# Altium footprint library con-samtec.PCBLIB: 805 footprints (part 54 of 55) (continued)
## TSW-149-02-S-T [mm] (continued)
  rectangle: -7.97,-0.35 -7.27,0.35
  rectangle: -7.97,2.19 -7.27,2.89
  rectangle: -5.43,-2.89 -4.73,-2.19
  rectangle: -5.43,-0.35 -4.73,0.35
  rectangle: -5.43,2.19 -4.73,2.89
  rectangle: -2.89,-2.89 -2.19,-2.19
  rectangle: -2.89,-0.35 -2.19,0.35
  rectangle: -2.89,2.19 -2.19,2.89
  rectangle: -0.35,-2.89 0.35,-2.19
  rectangle: -0.35,-0.35 0.35,0.35
  rectangle: -0.35,2.19 0.35,2.89
  rectangle: 2.19,-2.89 2.89,-2.19
  rectangle: 2.19,-0.35 2.89,0.35
  rectangle: 2.19,2.19 2.89,2.89
  rectangle: 4.73,-2.89 5.43,-2.19
  rectangle: 4.73,-0.35 5.43,0.35
  rectangle: 4.73,2.19 5.43,2.89
  rectangle: 7.27,-2.89 7.97,-2.19
  rectangle: 7.27,-0.35 7.97,0.35
  rectangle: 7.27,2.19 7.97,2.89
  rectangle: 9.81,-2.89 10.51,-2.19
  rectangle: 9.81,-0.35 10.51,0.35
  rectangle: 9.81,2.19 10.51,2.89
  rectangle: 12.35,-2.89 13.05,-2.19
  rectangle: 12.35,-0.35 13.05,0.35
  rectangle: 12.35,2.19 13.05,2.89
  rectangle: 14.89,-2.89 15.59,-2.19
  rectangle: 14.89,-0.35 15.59,0.35
  rectangle: 14.89,2.19 15.59,2.89
  rectangle: 17.43,-2.89 18.13,-2.19
  rectangle: 17.43,-0.35 18.13,0.35
  rectangle: 17.43,2.19 18.13,2.89
  rectangle: 19.97,-2.89 20.67,-2.19
  rectangle: 19.97,-0.35 20.67,0.35
  rectangle: 19.97,2.19 20.67,2.89
  rectangle: 22.51,-2.89 23.21,-2.19
  rectangle: 22.51,-0.35 23.21,0.35
  rectangle: 22.51,2.19 23.21,2.89
  rectangle: 25.05,-2.89 25.75,-2.19
  rectangle: 25.05,-0.35 25.75,0.35
  rectangle: 25.05,2.19 25.75,2.89
  rectangle: 27.59,-2.89 28.29,-2.19
  rectangle: 27.59,-0.35 28.29,0.35
  rectangle: 27.59,2.19 28.29,2.89
  rectangle: 30.13,-2.89 30.83,-2.19
  rectangle: 30.13,-0.35 30.83,0.35
  rectangle: 30.13,2.19 30.83,2.89
  rectangle: 32.67,-2.89 33.37,-2.19
  rectangle: 32.67,-0.35 33.37,0.35
  rectangle: 32.67,2.19 33.37,2.89
  rectangle: 35.21,-2.89 35.91,-2.19
  rectangle: 35.21,-0.35 35.91,0.35
  rectangle: 35.21,2.19 35.91,2.89
  rectangle: 37.75,-2.89 38.45,-2.19
  rectangle: 37.75,-0.35 38.45,0.35
  rectangle: 37.75,2.19 38.45,2.89
  rectangle: 40.29,-2.89 40.99,-2.19
  rectangle: 40.29,-0.35 40.99,0.35
  rectangle: 40.29,2.19 40.99,2.89
  rectangle: 42.83,-2.89 43.53,-2.19
  rectangle: 42.83,-0.35 43.53,0.35
  rectangle: 42.83,2.19 43.53,2.89
  rectangle: 45.37,-2.89 46.07,-2.19
  rectangle: 45.37,-0.35 46.07,0.35
  rectangle: 45.37,2.19 46.07,2.89
  rectangle: 47.91,-2.89 48.61,-2.19
  rectangle: 47.91,-0.35 48.61,0.35
  rectangle: 47.91,2.19 48.61,2.89
  rectangle: 50.45,-2.89 51.15,-2.19
  rectangle: 50.45,-0.35 51.15,0.35
  rectangle: 50.45,2.19 51.15,2.89
  rectangle: 52.99,-2.89 53.69,-2.19
  rectangle: 52.99,-0.35 53.69,0.35
  rectangle: 52.99,2.19 53.69,2.89
  rectangle: 55.53,-2.89 56.23,-2.19
  rectangle: 55.53,-0.35 56.23,0.35
  rectangle: 55.53,2.19 56.23,2.89
  rectangle: 58.07,-2.89 58.77,-2.19
  rectangle: 58.07,-0.35 58.77,0.35
  rectangle: 58.07,2.19 58.77,2.89
  rectangle: 60.61,-2.89 61.31,-2.19
  rectangle: 60.61,-0.35 61.31,0.35
  rectangle: 60.61,2.19 61.31,2.89

## TSW-149-02-S-T-RA [mil]
pads (147):
  oct 59.06x59.06 hole 39.37: 1(2400,60) 2(2400,160) 3(2400,260) 4(2300,60) 5(2300,160) 6(2300,260) 7(2200,60) 8(2200,160) 9(2200,260) 10(2100,60) 11(2100,160) 12(2100,260) 13(2000,60) 14(2000,160) 15(2000,260) 16(1900,60) 17(1900,160) 18(1900,260) 19(1800,60) 20(1800,160) 21(1800,260) 22(1700,60) 23(1700,160) 24(1700,260) 25(1600,60) 26(1600,160) 27(1600,260) 28(1500,60) 29(1500,160) 30(1500,260) 31(1400,60) 32(1400,160) 33(1400,260) 34(1300,60) 35(1300,160) 36(1300,260) 37(1200,60) 38(1200,160) 39(1200,260) 40(1100,60) 41(1100,160) 42(1100,260) 43(1000,60) 44(1000,160) 45(1000,260) 46(900,60) 47(900,160) 48(900,260) 49(800,60) 50(800,160) 51(800,260) 52(700,60) 53(700,160) 54(700,260) 55(600,60) 56(600,160) 57(600,260) 58(500,60) 59(500,160) 60(500,260) 61(400,60) 62(400,160) 63(400,260) 64(300,60) 65(300,160) 66(300,260) 67(200,60) 68(200,160) 69(200,260) 70(100,60) 71(100,160) 72(100,260) 73(0,60) 74(0,160) 75(0,260) 76(-100,60) 77(-100,160) 78(-100,260) 79(-200,60) 80(-200,160) 81(-200,260) 82(-300,60) 83(-300,160) 84(-300,260) 85(-400,60) 86(-400,160) 87(-400,260) 88(-500,60) 89(-500,160) 90(-500,260) 91(-600,60) 92(-600,160) 93(-600,260) 94(-700,60) 95(-700,160) 96(-700,260) 97(-800,60) 98(-800,160) 99(-800,260) 100(-900,60) 101(-900,160) 102(-900,260) 103(-1000,60) 104(-1000,160) 105(-1000,260) 106(-1100,60) 107(-1100,160) 108(-1100,260) 109(-1200,60) 110(-1200,160) 111(-1200,260) 112(-1300,60) 113(-1300,160) 114(-1300,260) 115(-1400,60) 116(-1400,160) 117(-1400,260) 118(-1500,60) 119(-1500,160) 120(-1500,260) 121(-1600,60) 122(-1600,160) 123(-1600,260) 124(-1700,60) 125(-1700,160) 126(-1700,260) 127(-1800,60) 128(-1800,160) 129(-1800,260) 130(-1900,60) 131(-1900,160) 132(-1900,260) 133(-2000,60) 134(-2000,160) 135(-2000,260) 136(-2100,60) 137(-2100,160) 138(-2100,260) 139(-2200,60) 140(-2200,160) 141(-2200,260) 142(-2300,60) 143(-2300,160) 144(-2300,260) 145(-2400,60) 146(-2400,160) 147(-2400,260)
Top Overlay:
  rectangle: -2410,-310.63 -2390,-80.32
  rectangle: -2310,-310.63 -2290,-80.32
  rectangle: -2210,-310.63 -2190,-80.32
  rectangle: -2110,-310.63 -2090,-80.32
  rectangle: -2010,-310.63 -1990,-80.32
  rectangle: -1910,-310.63 -1890,-80.32
  rectangle: -1810,-310.63 -1790,-80.32
  rectangle: -1710,-310.63 -1690,-80.32
  rectangle: -1610,-310.63 -1590,-80.32
  rectangle: -1510,-310.63 -1490,-80.32
  rectangle: -1410,-310.63 -1390,-80.32
  rectangle: -1310,-310.63 -1290,-80.32
  rectangle: -1210,-310.63 -1190,-80.32
  rectangle: -1110,-310.63 -1090,-80.32
  rectangle: -1010,-310.63 -990,-80.32
  rectangle: -910,-310.63 -890,-80.32
  rectangle: -810,-310.63 -790,-80.32
  rectangle: -710,-310.63 -690,-80.32
  rectangle: -610,-310.63 -590,-80.32
  rectangle: -510,-310.63 -490,-80.32
  rectangle: -410,-310.63 -390,-80.32
  rectangle: -310,-310.63 -290,-80.32
  rectangle: -210,-310.63 -190,-80.32
  rectangle: -110,-310.63 -90,-80.32
  rectangle: -10,-310.63 10,-80.32
  rectangle: 90,-310.63 110,-80.32
  rectangle: 190,-310.63 210,-80.32
  rectangle: 290,-310.63 310,-80.32
  rectangle: 390,-310.63 410,-80.32
  rectangle: 490,-310.63 510,-80.32
  rectangle: 590,-310.63 610,-80.32
  rectangle: 690,-310.63 710,-80.32
  rectangle: 790,-310.63 810,-80.32
  rectangle: 890,-310.63 910,-80.32
  rectangle: 990,-310.63 1010,-80.32
  rectangle: 1090,-310.63 1110,-80.32
  rectangle: 1190,-310.63 1210,-80.32
  rectangle: 1290,-310.63 1310,-80.32
  rectangle: 1390,-310.63 1410,-80.32
  rectangle: 1490,-310.63 1510,-80.32
  rectangle: 1590,-310.63 1610,-80.32
  rectangle: 1690,-310.63 1710,-80.32
  rectangle: 1790,-310.63 1810,-80.32
  rectangle: 1890,-310.63 1910,-80.32
  rectangle: 1990,-310.63 2010,-80.32
  rectangle: 2090,-310.63 2110,-80.32
  rectangle: 2190,-310.63 2210,-80.32
  rectangle: 2290,-310.63 2310,-80.32
  rectangle: 2390,-310.63 2410,-80.32
  lines w8: -2455.08,-80.55 2455.08,-80.55 2455.08,-4.17 -2455.08,-4.17 -2455.08,-80.55
  text "1" at 2451.57,41.34 h36.81
  text "3" at 2452.17,236.81 h36.81
Mechanical 16:
  rectangle: -2410,0 -2390,270
  rectangle: -2310,0 -2290,270
  rectangle: -2210,0 -2190,270
  rectangle: -2110,0 -2090,270
  rectangle: -2010,0 -1990,270
  rectangle: -1910,0 -1890,270
  rectangle: -1810,0 -1790,270
  rectangle: -1710,0 -1690,270
  rectangle: -1610,0 -1590,270
  rectangle: -1510,0 -1490,270
  rectangle: -1410,0 -1390,270
  rectangle: -1310,0 -1290,270
  rectangle: -1210,0 -1190,270
  rectangle: -1110,0 -1090,270
  rectangle: -1010,0 -990,270
  rectangle: -910,0 -890,270
  rectangle: -810,0 -790,270
  rectangle: -710,0 -690,270
  rectangle: -610,0 -590,270
  rectangle: -510,0 -490,270
  rectangle: -410,0 -390,270
  rectangle: -310,0 -290,270
  rectangle: -210,0 -190,270
  rectangle: -110,0 -90,270
  rectangle: -10,0 10,270
  rectangle: 90,0 110,270
  rectangle: 190,0 210,270
  rectangle: 290,0 310,270
  rectangle: 390,0 410,270
  rectangle: 490,0 510,270
  rectangle: 590,0 610,270
  rectangle: 690,0 710,270
  rectangle: 790,0 810,270
  rectangle: 890,0 910,270
  rectangle: 990,0 1010,270
  rectangle: 1090,0 1110,270
  rectangle: 1190,0 1210,270
  rectangle: 1290,0 1310,270
  rectangle: 1390,0 1410,270
  rectangle: 1490,0 1510,270
  rectangle: 1590,0 1610,270
  rectangle: 1690,0 1710,270
  rectangle: 1790,0 1810,270
  rectangle: 1890,0 1910,270
  rectangle: 1990,0 2010,270
  rectangle: 2090,0 2110,270
  rectangle: 2190,0 2210,270
  rectangle: 2290,0 2310,270
  rectangle: 2390,0 2410,270

## TSW-150-02-S-D [mm]
pads (100):
  oct 1.5x1.5 hole 1: 1(62.23,-1.27) 2(62.23,1.27) 3(59.69,-1.27) 4(59.69,1.27) 5(57.15,-1.27) 6(57.15,1.27) 7(54.61,-1.27) 8(54.61,1.27) 9(52.07,-1.27) 10(52.07,1.27) 11(49.53,-1.27) 12(49.53,1.27) 13(46.99,-1.27) 14(46.99,1.27) 15(44.45,-1.27) 16(44.45,1.27) 17(41.91,-1.27) 18(41.91,1.27) 19(39.37,-1.27) 20(39.37,1.27) 21(36.83,-1.27) 22(36.83,1.27) 23(34.29,-1.27) 24(34.29,1.27) 25(31.75,-1.27) 26(31.75,1.27) 27(29.21,-1.27) 28(29.21,1.27) 29(26.67,-1.27) 30(26.67,1.27) 31(24.13,-1.27) 32(24.13,1.27) 33(21.59,-1.27) 34(21.59,1.27) 35(19.05,-1.27) 36(19.05,1.27) 37(16.51,-1.27) 38(16.51,1.27) 39(13.97,-1.27) 40(13.97,1.27) 41(11.43,-1.27) 42(11.43,1.27) 43(8.89,-1.27) 44(8.89,1.27) 45(6.35,-1.27) 46(6.35,1.27) 47(3.81,-1.27) 48(3.81,1.27) 49(1.27,-1.27) 50(1.27,1.27) 51(-1.27,-1.27) 52(-1.27,1.27) 53(-3.81,-1.27) 54(-3.81,1.27) 55(-6.35,-1.27) 56(-6.35,1.27) 57(-8.89,-1.27) 58(-8.89,1.27) 59(-11.43,-1.27) 60(-11.43,1.27) 61(-13.97,-1.27) 62(-13.97,1.27) 63(-16.51,-1.27) 64(-16.51,1.27) 65(-19.05,-1.27) 66(-19.05,1.27) 67(-21.59,-1.27) 68(-21.59,1.27) 69(-24.13,-1.27) 70(-24.13,1.27) 71(-26.67,-1.27) 72(-26.67,1.27) 73(-29.21,-1.27) 74(-29.21,1.27) 75(-31.75,-1.27) 76(-31.75,1.27) 77(-34.29,-1.27) 78(-34.29,1.27) 79(-36.83,-1.27) 80(-36.83,1.27) 81(-39.37,-1.27) 82(-39.37,1.27) 83(-41.91,-1.27) 84(-41.91,1.27) 85(-44.45,-1.27) 86(-44.45,1.27) 87(-46.99,-1.27) 88(-46.99,1.27) 89(-49.53,-1.27) 90(-49.53,1.27) 91(-52.07,-1.27) 92(-52.07,1.27) 93(-54.61,-1.27) 94(-54.61,1.27) 95(-57.15,-1.27) 96(-57.15,1.27) 97(-59.69,-1.27) 98(-59.69,1.27) 99(-62.23,-1.27) 100(-62.23,1.27)
Top Overlay:
  lines w0.203: -63.629,-2.425 63.629,-2.425 63.629,2.425 -63.629,2.425 -63.629,-2.425
  text "1" at 62.022,-3.818 h0.94
  text "2" at 61.847,2.744 h0.94
  text "99" at -63.25,-3.768 h0.94
  text "100" at -63.604,2.694 h0.94
Mechanical 16:
  rectangle: -62.58,-1.62 -61.88,-0.92
  rectangle: -62.58,0.92 -61.88,1.62
  rectangle: -60.04,-1.62 -59.34,-0.92
  rectangle: -60.04,0.92 -59.34,1.62
  rectangle: -57.5,-1.62 -56.8,-0.92
  rectangle: -57.5,0.92 -56.8,1.62
  rectangle: -54.96,-1.62 -54.26,-0.92
  rectangle: -54.96,0.92 -54.26,1.62
  rectangle: -52.42,-1.62 -51.72,-0.92
  rectangle: -52.42,0.92 -51.72,1.62
  rectangle: -49.88,-1.62 -49.18,-0.92
  rectangle: -49.88,0.92 -49.18,1.62
  rectangle: -47.34,-1.62 -46.64,-0.92
  rectangle: -47.34,0.92 -46.64,1.62
  rectangle: -44.8,-1.62 -44.1,-0.92
  rectangle: -44.8,0.92 -44.1,1.62
  rectangle: -42.26,-1.62 -41.56,-0.92
  rectangle: -42.26,0.92 -41.56,1.62
  rectangle: -39.72,-1.62 -39.02,-0.92
  rectangle: -39.72,0.92 -39.02,1.62
  rectangle: -37.18,-1.62 -36.48,-0.92
  rectangle: -37.18,0.92 -36.48,1.62
  rectangle: -34.64,-1.62 -33.94,-0.92
  rectangle: -34.64,0.92 -33.94,1.62
  rectangle: -32.1,-1.62 -31.4,-0.92
  rectangle: -32.1,0.92 -31.4,1.62
  rectangle: -29.56,-1.62 -28.86,-0.92
  rectangle: -29.56,0.92 -28.86,1.62
  rectangle: -27.02,-1.62 -26.32,-0.92
  rectangle: -27.02,0.92 -26.32,1.62
  rectangle: -24.48,-1.62 -23.78,-0.92
  rectangle: -24.48,0.92 -23.78,1.62
  rectangle: -21.94,-1.62 -21.24,-0.92
  rectangle: -21.94,0.92 -21.24,1.62
  rectangle: -19.4,-1.62 -18.7,-0.92
  rectangle: -19.4,0.92 -18.7,1.62
  rectangle: -16.86,-1.62 -16.16,-0.92
  rectangle: -16.86,0.92 -16.16,1.62
  rectangle: -14.32,-1.62 -13.62,-0.92
  rectangle: -14.32,0.92 -13.62,1.62
  rectangle: -11.78,-1.62 -11.08,-0.92
  rectangle: -11.78,0.92 -11.08,1.62
  rectangle: -9.24,-1.62 -8.54,-0.92
  rectangle: -9.24,0.92 -8.54,1.62
  rectangle: -6.7,-1.62 -6,-0.92
  rectangle: -6.7,0.92 -6,1.62
  rectangle: -4.16,-1.62 -3.46,-0.92
  rectangle: -4.16,0.92 -3.46,1.62
  rectangle: -1.62,-1.62 -0.92,-0.92
  rectangle: -1.62,0.92 -0.92,1.62
  rectangle: 0.92,-1.62 1.62,-0.92
  rectangle: 0.92,0.92 1.62,1.62
  rectangle: 3.46,-1.62 4.16,-0.92
  rectangle: 3.46,0.92 4.16,1.62
  rectangle: 6,-1.62 6.7,-0.92
  rectangle: 6,0.92 6.7,1.62
  rectangle: 8.54,-1.62 9.24,-0.92
  rectangle: 8.54,0.92 9.24,1.62
  rectangle: 11.08,-1.62 11.78,-0.92
  rectangle: 11.08,0.92 11.78,1.62
  rectangle: 13.62,-1.62 14.32,-0.92
  rectangle: 13.62,0.92 14.32,1.62
  rectangle: 16.16,-1.62 16.86,-0.92
  rectangle: 16.16,0.92 16.86,1.62
  rectangle: 18.7,-1.62 19.4,-0.92
  rectangle: 18.7,0.92 19.4,1.62
  rectangle: 21.24,-1.62 21.94,-0.92
  rectangle: 21.24,0.92 21.94,1.62
  rectangle: 23.78,-1.62 24.48,-0.92
  rectangle: 23.78,0.92 24.48,1.62
  rectangle: 26.32,-1.62 27.02,-0.92
  rectangle: 26.32,0.92 27.02,1.62
  rectangle: 28.86,-1.62 29.56,-0.92
  rectangle: 28.86,0.92 29.56,1.62
  rectangle: 31.4,-1.62 32.1,-0.92
  rectangle: 31.4,0.92 32.1,1.62
  rectangle: 33.94,-1.62 34.64,-0.92
  rectangle: 33.94,0.92 34.64,1.62
  rectangle: 36.48,-1.62 37.18,-0.92
  rectangle: 36.48,0.92 37.18,1.62
  rectangle: 39.02,-1.62 39.72,-0.92
  rectangle: 39.02,0.92 39.72,1.62
  rectangle: 41.56,-1.62 42.26,-0.92
  rectangle: 41.56,0.92 42.26,1.62
  rectangle: 44.1,-1.62 44.8,-0.92
  rectangle: 44.1,0.92 44.8,1.62
  rectangle: 46.64,-1.62 47.34,-0.92
  rectangle: 46.64,0.92 47.34,1.62
  rectangle: 49.18,-1.62 49.88,-0.92
  rectangle: 49.18,0.92 49.88,1.62
  rectangle: 51.72,-1.62 52.42,-0.92
  rectangle: 51.72,0.92 52.42,1.62
  rectangle: 54.26,-1.62 54.96,-0.92
  rectangle: 54.26,0.92 54.96,1.62
  rectangle: 56.8,-1.62 57.5,-0.92
  rectangle: 56.8,0.92 57.5,1.62
  rectangle: 59.34,-1.62 60.04,-0.92
  rectangle: 59.34,0.92 60.04,1.62
  rectangle: 61.88,-1.62 62.58,-0.92
  rectangle: 61.88,0.92 62.58,1.62

## TSW-150-02-S-D-RA [mil]
pads (100):
  oct 59.06x59.06 hole 39.37: 1(2450,60) 2(2450,160) 3(2350,60) 4(2350,160) 5(2250,60) 6(2250,160) 7(2150,60) 8(2150,160) 9(2050,60) 10(2050,160) 11(1950,60) 12(1950,160) 13(1850,60) 14(1850,160) 15(1750,60) 16(1750,160) 17(1650,60) 18(1650,160) 19(1550,60) 20(1550,160) 21(1450,60) 22(1450,160) 23(1350,60) 24(1350,160) 25(1250,60) 26(1250,160) 27(1150,60) 28(1150,160) 29(1050,60) 30(1050,160) 31(950,60) 32(950,160) 33(850,60) 34(850,160) 35(750,60) 36(750,160) 37(650,60) 38(650,160) 39(550,60) 40(550,160) 41(450,60) 42(450,160) 43(350,60) 44(350,160) 45(250,60) 46(250,160) 47(150,60) 48(150,160) 49(50,60) 50(50,160) 51(-50,60) 52(-50,160) 53(-150,60) 54(-150,160) 55(-250,60) 56(-250,160) 57(-350,60) 58(-350,160) 59(-450,60) 60(-450,160) 61(-550,60) 62(-550,160) 63(-650,60) 64(-650,160) 65(-750,60) 66(-750,160) 67(-850,60) 68(-850,160) 69(-950,60) 70(-950,160) 71(-1050,60) 72(-1050,160) 73(-1150,60) 74(-1150,160) 75(-1250,60) 76(-1250,160) 77(-1350,60) 78(-1350,160) 79(-1450,60) 80(-1450,160) 81(-1550,60) 82(-1550,160) 83(-1650,60) 84(-1650,160) 85(-1750,60) 86(-1750,160) 87(-1850,60) 88(-1850,160) 89(-1950,60) 90(-1950,160) 91(-2050,60) 92(-2050,160) 93(-2150,60) 94(-2150,160) 95(-2250,60) 96(-2250,160) 97(-2350,60) 98(-2350,160) 99(-2450,60) 100(-2450,160)
Top Overlay:
  rectangle: -2460,-310.63 -2440,-80.32
  rectangle: -2360,-310.63 -2340,-80.32
  rectangle: -2260,-310.63 -2240,-80.32
  rectangle: -2160,-310.63 -2140,-80.32
  rectangle: -2060,-310.63 -2040,-80.32
  rectangle: -1960,-310.63 -1940,-80.32
  rectangle: -1860,-310.63 -1840,-80.32
  rectangle: -1760,-310.63 -1740,-80.32
  rectangle: -1660,-310.63 -1640,-80.32
  rectangle: -1560,-310.63 -1540,-80.32
  rectangle: -1460,-310.63 -1440,-80.32
  rectangle: -1360,-310.63 -1340,-80.32
  rectangle: -1260,-310.63 -1240,-80.32
  rectangle: -1160,-310.63 -1140,-80.32
  rectangle: -1060,-310.63 -1040,-80.32
  rectangle: -960,-310.63 -940,-80.32
  rectangle: -860,-310.63 -840,-80.32
  rectangle: -760,-310.63 -740,-80.32
  rectangle: -660,-310.63 -640,-80.32
  rectangle: -560,-310.63 -540,-80.32
  rectangle: -460,-310.63 -440,-80.32
  rectangle: -360,-310.63 -340,-80.32
  rectangle: -260,-310.63 -240,-80.32
  rectangle: -160,-310.63 -140,-80.32
  rectangle: -60,-310.63 -40,-80.32
  rectangle: 40,-310.63 60,-80.32
  rectangle: 140,-310.63 160,-80.32
  rectangle: 240,-310.63 260,-80.32
  rectangle: 340,-310.63 360,-80.32
  rectangle: 440,-310.63 460,-80.32
  rectangle: 540,-310.63 560,-80.32
  rectangle: 640,-310.63 660,-80.32
  rectangle: 740,-310.63 760,-80.32
  rectangle: 840,-310.63 860,-80.32
  rectangle: 940,-310.63 960,-80.32
  rectangle: 1040,-310.63 1060,-80.32
  rectangle: 1140,-310.63 1160,-80.32
  rectangle: 1240,-310.63 1260,-80.32
  rectangle: 1340,-310.63 1360,-80.32
  rectangle: 1440,-310.63 1460,-80.32
  rectangle: 1540,-310.63 1560,-80.32
  rectangle: 1640,-310.63 1660,-80.32
  rectangle: 1740,-310.63 1760,-80.32
  rectangle: 1840,-310.63 1860,-80.32
  rectangle: 1940,-310.63 1960,-80.32
  rectangle: 2040,-310.63 2060,-80.32
  rectangle: 2140,-310.63 2160,-80.32
  rectangle: 2240,-310.63 2260,-80.32
  rectangle: 2340,-310.63 2360,-80.32
  rectangle: 2440,-310.63 2460,-80.32
  lines w8: -2505.08,-80.55 2505.08,-80.55 2505.08,-4.17 -2505.08,-4.17 -2505.08,-80.55
  text "1" at 2500.59,30.51 h36.81
  text "100" at -2603.54,137.01 h36.81
  text "99" at -2561.42,37.6 h36.81
  text "2" at 2499.21,129.53 h36.81
Mechanical 16:
  rectangle: -2460,0 -2440,170
  rectangle: -2360,0 -2340,170
  rectangle: -2260,0 -2240,170
  rectangle: -2160,0 -2140,170
  rectangle: -2060,0 -2040,170
  rectangle: -1960,0 -1940,170
  rectangle: -1860,0 -1840,170
  rectangle: -1760,0 -1740,170
  rectangle: -1660,0 -1640,170
  rectangle: -1560,0 -1540,170
  rectangle: -1460,0 -1440,170
  rectangle: -1360,0 -1340,170
  rectangle: -1260,0 -1240,170
  rectangle: -1160,0 -1140,170
  rectangle: -1060,0 -1040,170
  rectangle: -960,0 -940,170
  rectangle: -860,0 -840,170
  rectangle: -760,0 -740,170
  rectangle: -660,0 -640,170
  rectangle: -560,0 -540,170
  rectangle: -460,0 -440,170
  rectangle: -360,0 -340,170
  rectangle: -260,0 -240,170
  rectangle: -160,0 -140,170
  rectangle: -60,0 -40,170
  rectangle: 40,0 60,170
  rectangle: 140,0 160,170
  rectangle: 240,0 260,170
  rectangle: 340,0 360,170
  rectangle: 440,0 460,170
  rectangle: 540,0 560,170
  rectangle: 640,0 660,170
  rectangle: 740,0 760,170
  rectangle: 840,0 860,170
  rectangle: 940,0 960,170
  rectangle: 1040,0 1060,170
  rectangle: 1140,0 1160,170
  rectangle: 1240,0 1260,170
  rectangle: 1340,0 1360,170
  rectangle: 1440,0 1460,170
  rectangle: 1540,0 1560,170
  rectangle: 1640,0 1660,170
  rectangle: 1740,0 1760,170
  rectangle: 1840,0 1860,170
  rectangle: 1940,0 1960,170
  rectangle: 2040,0 2060,170
  rectangle: 2140,0 2160,170
  rectangle: 2240,0 2260,170
  rectangle: 2340,0 2360,170
  rectangle: 2440,0 2460,170

## TSW-150-02-S-Q [mm]
pads (100):
  oct 1.5x1.5 hole 1: 1(62.23,-2.54) 2(62.23,2.54) 3(59.69,-2.54) 4(59.69,2.54) 5(57.15,-2.54) 6(57.15,2.54) 7(54.61,-2.54) 8(54.61,2.54) 9(52.07,-2.54) 10(52.07,2.54) 11(49.53,-2.54) 12(49.53,2.54) 13(46.99,-2.54) 14(46.99,2.54) 15(44.45,-2.54) 16(44.45,2.54) 17(41.91,-2.54) 18(41.91,2.54) 19(39.37,-2.54) 20(39.37,2.54) 21(36.83,-2.54) 22(36.83,2.54) 23(34.29,-2.54) 24(34.29,2.54) 25(31.75,-2.54) 26(31.75,2.54) 27(29.21,-2.54) 28(29.21,2.54) 29(26.67,-2.54) 30(26.67,2.54) 31(24.13,-2.54) 32(24.13,2.54) 33(21.59,-2.54) 34(21.59,2.54) 35(19.05,-2.54) 36(19.05,2.54) 37(16.51,-2.54) 38(16.51,2.54) 39(13.97,-2.54) 40(13.97,2.54) 41(11.43,-2.54) 42(11.43,2.54) 43(8.89,-2.54) 44(8.89,2.54) 45(6.35,-2.54) 46(6.35,2.54) 47(3.81,-2.54) 48(3.81,2.54) 49(1.27,-2.54) 50(1.27,2.54) 51(-1.27,-2.54) 52(-1.27,2.54) 53(-3.81,-2.54) 54(-3.81,2.54) 55(-6.35,-2.54) 56(-6.35,2.54) 57(-8.89,-2.54) 58(-8.89,2.54) 59(-11.43,-2.54) 60(-11.43,2.54) 61(-13.97,-2.54) 62(-13.97,2.54) 63(-16.51,-2.54) 64(-16.51,2.54) 65(-19.05,-2.54) 66(-19.05,2.54) 67(-21.59,-2.54) 68(-21.59,2.54) 69(-24.13,-2.54) 70(-24.13,2.54) 71(-26.67,-2.54) 72(-26.67,2.54) 73(-29.21,-2.54) 74(-29.21,2.54) 75(-31.75,-2.54) 76(-31.75,2.54) 77(-34.29,-2.54) 78(-34.29,2.54) 79(-36.83,-2.54) 80(-36.83,2.54) 81(-39.37,-2.54) 82(-39.37,2.54) 83(-41.91,-2.54) 84(-41.91,2.54) 85(-44.45,-2.54) 86(-44.45,2.54) 87(-46.99,-2.54) 88(-46.99,2.54) 89(-49.53,-2.54) 90(-49.53,2.54) 91(-52.07,-2.54) 92(-52.07,2.54) 93(-54.61,-2.54) 94(-54.61,2.54) 95(-57.15,-2.54) 96(-57.15,2.54) 97(-59.69,-2.54) 98(-59.69,2.54) 99(-62.23,-2.54) 100(-62.23,2.54)
Top Overlay:
  lines w0.203: -63.629,-3.695 63.629,-3.695 63.629,3.695 -63.629,3.695 -63.629,-3.695
  text "1" at 62.072,-5.138 h0.94
  text "2" at 61.972,3.989 h0.94
  text "99" at -63.175,-5.038 h0.94
  text "100" at -63.479,3.964 h0.94
Mechanical 16:
  rectangle: -62.58,-2.89 -61.88,-2.19
  rectangle: -62.58,2.19 -61.88,2.89
  rectangle: -60.04,-2.89 -59.34,-2.19
  rectangle: -60.04,2.19 -59.34,2.89
  rectangle: -57.5,-2.89 -56.8,-2.19
  rectangle: -57.5,2.19 -56.8,2.89
  rectangle: -54.96,-2.89 -54.26,-2.19
  rectangle: -54.96,2.19 -54.26,2.89
  rectangle: -52.42,-2.89 -51.72,-2.19
  rectangle: -52.42,2.19 -51.72,2.89
  rectangle: -49.88,-2.89 -49.18,-2.19
  rectangle: -49.88,2.19 -49.18,2.89
  rectangle: -47.34,-2.89 -46.64,-2.19
  rectangle: -47.34,2.19 -46.64,2.89
  rectangle: -44.8,-2.89 -44.1,-2.19
  rectangle: -44.8,2.19 -44.1,2.89
  rectangle: -42.26,-2.89 -41.56,-2.19
  rectangle: -42.26,2.19 -41.56,2.89
  rectangle: -39.72,-2.89 -39.02,-2.19
  rectangle: -39.72,2.19 -39.02,2.89
  rectangle: -37.18,-2.89 -36.48,-2.19
  rectangle: -37.18,2.19 -36.48,2.89
  rectangle: -34.64,-2.89 -33.94,-2.19
  rectangle: -34.64,2.19 -33.94,2.89
  rectangle: -32.1,-2.89 -31.4,-2.19
  rectangle: -32.1,2.19 -31.4,2.89
  rectangle: -29.56,-2.89 -28.86,-2.19
  rectangle: -29.56,2.19 -28.86,2.89
  rectangle: -27.02,-2.89 -26.32,-2.19
  rectangle: -27.02,2.19 -26.32,2.89
  rectangle: -24.48,-2.89 -23.78,-2.19
  rectangle: -24.48,2.19 -23.78,2.89
  rectangle: -21.94,-2.89 -21.24,-2.19
  rectangle: -21.94,2.19 -21.24,2.89
  rectangle: -19.4,-2.89 -18.7,-2.19
  rectangle: -19.4,2.19 -18.7,2.89
  rectangle: -16.86,-2.89 -16.16,-2.19
  rectangle: -16.86,2.19 -16.16,2.89
  rectangle: -14.32,-2.89 -13.62,-2.19
  rectangle: -14.32,2.19 -13.62,2.89
  rectangle: -11.78,-2.89 -11.08,-2.19
  rectangle: -11.78,2.19 -11.08,2.89
  rectangle: -9.24,-2.89 -8.54,-2.19
  rectangle: -9.24,2.19 -8.54,2.89
  rectangle: -6.7,-2.89 -6,-2.19
  rectangle: -6.7,2.19 -6,2.89
  rectangle: -4.16,-2.89 -3.46,-2.19
  rectangle: -4.16,2.19 -3.46,2.89
  rectangle: -1.62,-2.89 -0.92,-2.19
  rectangle: -1.62,2.19 -0.92,2.89
  rectangle: 0.92,-2.89 1.62,-2.19
  rectangle: 0.92,2.19 1.62,2.89
  rectangle: 3.46,-2.89 4.16,-2.19
  rectangle: 3.46,2.19 4.16,2.89
  rectangle: 6,-2.89 6.7,-2.19
  rectangle: 6,2.19 6.7,2.89
  rectangle: 8.54,-2.89 9.24,-2.19
  rectangle: 8.54,2.19 9.24,2.89
  rectangle: 11.08,-2.89 11.78,-2.19
  rectangle: 11.08,2.19 11.78,2.89
  rectangle: 13.62,-2.89 14.32,-2.19
  rectangle: 13.62,2.19 14.32,2.89
  rectangle: 16.16,-2.89 16.86,-2.19
  rectangle: 16.16,2.19 16.86,2.89
  rectangle: 18.7,-2.89 19.4,-2.19
  rectangle: 18.7,2.19 19.4,2.89
  rectangle: 21.24,-2.89 21.94,-2.19
  rectangle: 21.24,2.19 21.94,2.89
  rectangle: 23.78,-2.89 24.48,-2.19
  rectangle: 23.78,2.19 24.48,2.89
  rectangle: 26.32,-2.89 27.02,-2.19
  rectangle: 26.32,2.19 27.02,2.89
  rectangle: 28.86,-2.89 29.56,-2.19
  rectangle: 28.86,2.19 29.56,2.89
  rectangle: 31.4,-2.89 32.1,-2.19
  rectangle: 31.4,2.19 32.1,2.89
  rectangle: 33.94,-2.89 34.64,-2.19
  rectangle: 33.94,2.19 34.64,2.89
  rectangle: 36.48,-2.89 37.18,-2.19
  rectangle: 36.48,2.19 37.18,2.89
  rectangle: 39.02,-2.89 39.72,-2.19
  rectangle: 39.02,2.19 39.72,2.89
  rectangle: 41.56,-2.89 42.26,-2.19
  rectangle: 41.56,2.19 42.26,2.89
  rectangle: 44.1,-2.89 44.8,-2.19
  rectangle: 44.1,2.19 44.8,2.89
  rectangle: 46.64,-2.89 47.34,-2.19
  rectangle: 46.64,2.19 47.34,2.89
  rectangle: 49.18,-2.89 49.88,-2.19
  rectangle: 49.18,2.19 49.88,2.89
  rectangle: 51.72,-2.89 52.42,-2.19
  rectangle: 51.72,2.19 52.42,2.89
  rectangle: 54.26,-2.89 54.96,-2.19
  rectangle: 54.26,2.19 54.96,2.89
  rectangle: 56.8,-2.89 57.5,-2.19
  rectangle: 56.8,2.19 57.5,2.89
  rectangle: 59.34,-2.89 60.04,-2.19
  rectangle: 59.34,2.19 60.04,2.89
  rectangle: 61.88,-2.89 62.58,-2.19
  rectangle: 61.88,2.19 62.58,2.89